# Altium footprint library CMR_Connectors.PcbLib: 71 footprints (part 2 of 5)
Each footprint in its own frame and in the unit in brackets; x right, y up, seen from the top. Pads: shape width x height; smd on the part's side, far side on the other; paste and mask are expansions set on the pad; w line width, h text height; cw(c..) or ccw(c..) is an arc to the next point about the centre after c.
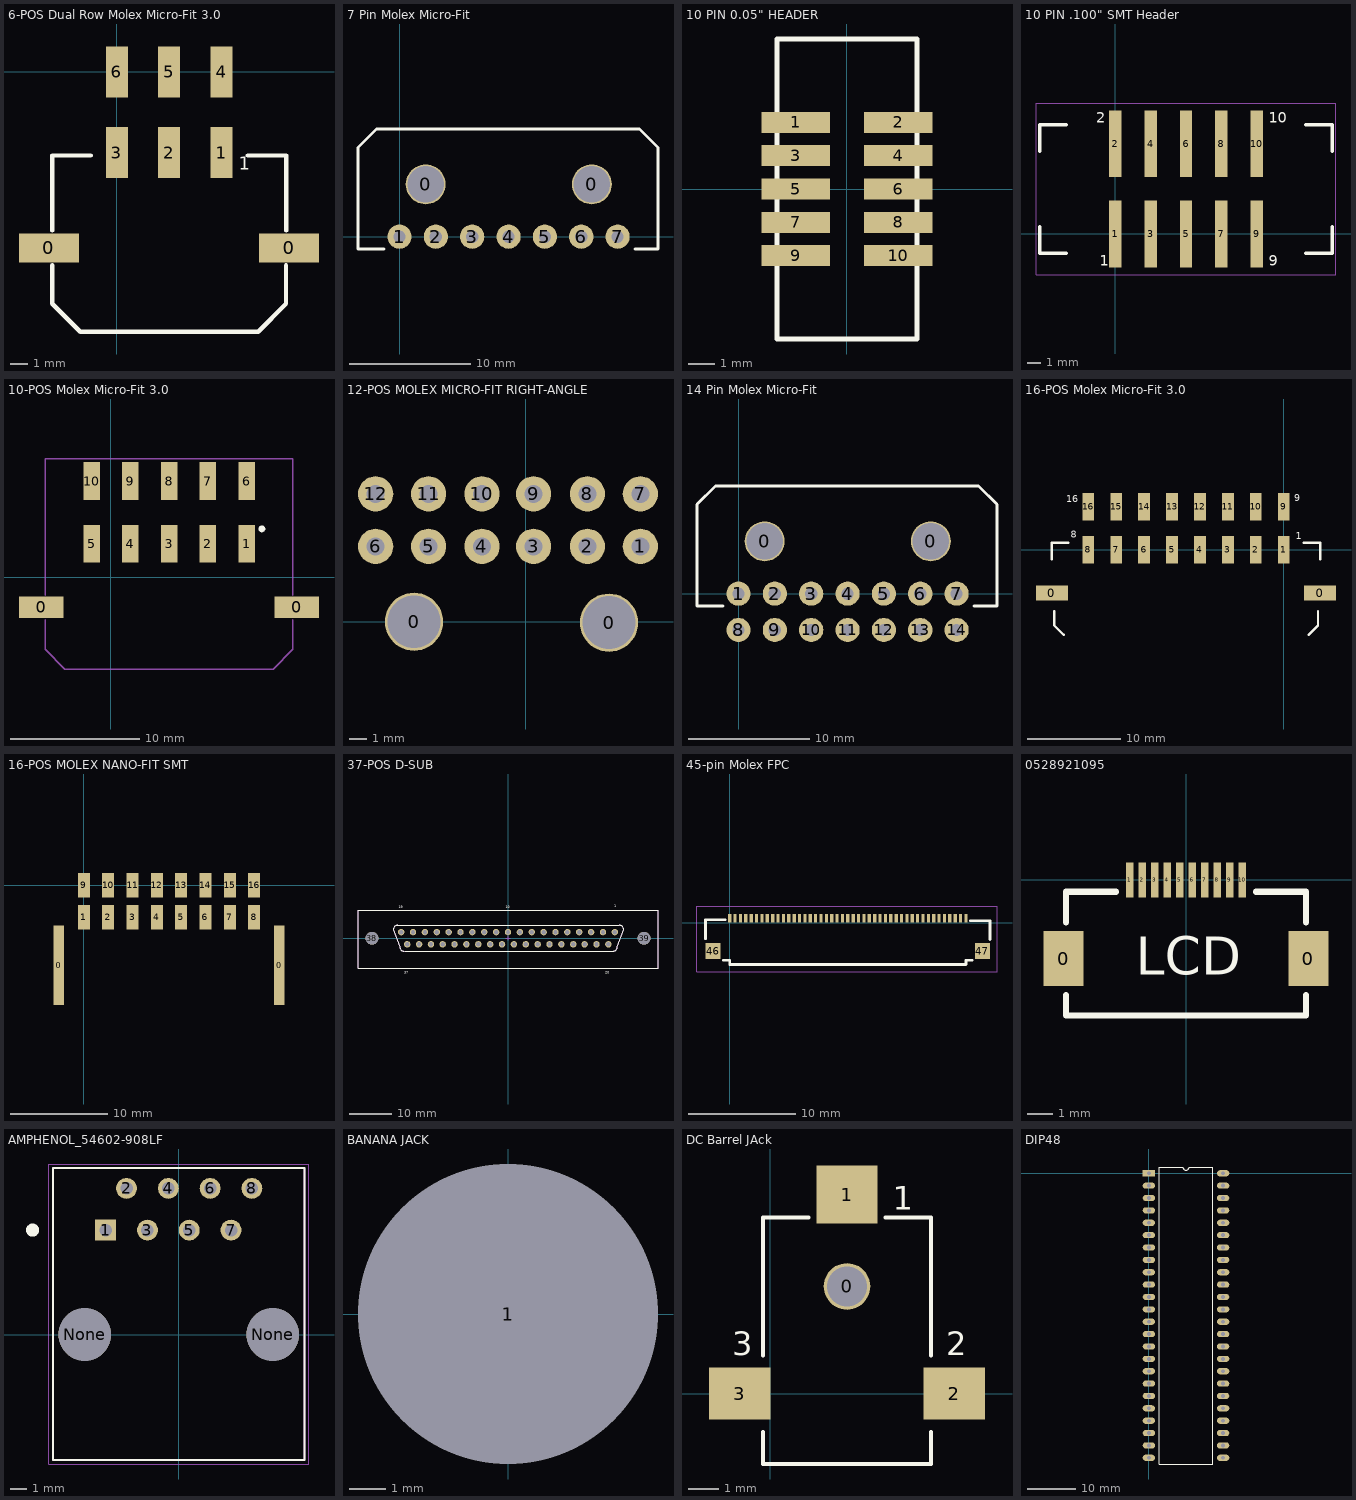
[diagram p1: the footprints below, top view; thin cyan lines are the x and y axes]

## 6-POS Dual Row Molex Micro-Fit 3.0 [mm] "6-POS Dual Row SMT HEADER, Molex Micro-Fit 3.0"
height 8.763
pads (8):
  rect 3.43x1.65 smd: 0(-3.895,-10.1) 0(9.875,-10.1)
  rect 1.27x2.92 smd: 1(6,-4.63) 2(3,-4.63) 3(0,-4.63) 4(6,0) 5(3,0) 6(0,0)
Top Overlay:
  lines w0.254: -3.7,-11.1 -3.7,-13.3 -2.1,-14.9 3,-14.9 8.1,-14.9 9.7,-13.3 9.7,-11.1 ; -3.7,-9.1 -3.7,-4.8 -1.5,-4.8 ; 7.5,-4.8 9.7,-4.8 9.7,-9.1
  text "1" at 7,-5.63 h0.76
3D body "430250600.stp": height 10.66, standoff -0.19, extent -1.9,-28.75 7.95,-14.75
3D body "430450610.stp": height 8.76, standoff -0.05, extent -5.325,-14.655 11.325,0.745

## 7 Pin Molex Micro-Fit [mm] "7 Pin Molex Micro-Fit"
pads (9):
  round 3.302 hole 2.997: 0(2.159,4.318) 0(15.875,4.318)
  round 2 hole 1.016: 1(0,0) 2(3,0) 3(6,0) 4(9,0) 5(12,0) 6(15,0) 7(18,0)
Top Overlay:
  lines w0.254: -1.27,-1.016 -3.429,-1.016 -3.429,3.175 -3.429,5.715 -3.429,7.366 -1.905,8.89 4.699,8.89 19.812,8.89 21.336,7.366 21.336,5.715 21.336,3.048 21.336,-1.016 19.431,-1.016
3D body "436500700.stp": height 5.55, standoff -3.36, extent -3.303,-1.013 21.337,8.887
3D body "436450700.stp": height 6.96, standoff -0.25, extent -1.925,9.05 19.925,23.05

## 10 PIN 0.05" HEADER [mm]
height 5.4
pads (10):
  rect 2.6x0.8 smd: 1(-1.95,2.54) 2(1.95,2.54) 3(-1.95,1.27) 4(1.95,1.27) 5(-1.95,0) 6(1.95,0) 7(-1.95,-1.27) 8(1.95,-1.27) 9(-1.95,-2.54) 10(1.95,-2.54)
Top Overlay:
  lines w0.2: -0.318,5.715 2.667,5.715 2.667,-5.715 -2.667,-5.715 -2.667,5.715 0.318,5.715
  text "." at -3.937,2.413 h1.52
3D body: height 5.4, standoff 0, extent -2.54,-5.588 2.54,5.588

## 10 PIN .100" SMT Header [mm]
height 9.8
pads (10):
  rect 0.89x4.8 smd: 1(0,0) 2(0,6.5) 3(2.54,0) 4(2.54,6.5) 5(5.08,0) 6(5.08,6.5) 7(7.62,0) 8(7.62,6.5) 9(10.16,0) 10(10.16,6.5)
Top Overlay:
  lines w0.254: -5.461,0.508 -5.461,-1.397 -3.556,-1.397 ; -5.461,5.969 -5.461,7.874 -3.556,7.874 ; 13.716,-1.397 15.621,-1.397 15.621,0.508 ; 13.716,7.874 15.621,7.874 15.621,5.969
  text "10" at 11.049,8.001 h0.76
  text "9" at 11.049,-2.286 h0.76
  text "2" at -1.397,8.001 h0.76
  text "1" at -1.143,-2.286 h0.76
Mechanical 15:
  lines w0.051: -5.715,-2.921 15.875,-2.921 15.875,9.398 -5.715,9.398 -5.715,-2.921
3D body "IDC.STEP": height 12.31, standoff 1.81, extent -3.557,-0.492 13.704,6.458
3D body: height 1.8, standoff 0.8, extent -5.22,-1.15 15.38,7.65
3D body: height 9.8, standoff 0.8, extent -5.22,-1.15 -4.52,7.65
3D body: height 9.8, standoff 0.8, extent -5.22,6.95 15.38,7.65
3D body: height 9.8, standoff 0.8, extent 14.68,-1.15 15.38,7.65
3D body: height 9.8, standoff 0.8, extent 7.38,-1.15 15.38,-0.45
3D body: height 9.8, standoff 0.8, extent -5.22,-1.15 2.78,-0.45
3D body: height 0.8, standoff 0, extent -0.315,-1.92 0.325,2.305
3D body: height 8, standoff 0.8, extent -0.315,1.665 0.325,2.305
3D body: height 8, standoff 0.8, extent -0.315,4.205 0.325,4.845
3D body: height 8, standoff 0.8, extent 2.22,1.665 2.86,2.305
3D body: height 8, standoff 0.8, extent 2.22,4.205 2.86,4.845
3D body: height 8, standoff 0.8, extent 4.76,1.665 5.4,2.305
3D body: height 8, standoff 0.8, extent 4.76,4.205 5.4,4.845
3D body: height 8, standoff 0.8, extent 7.3,1.665 7.94,2.305
3D body: height 8, standoff 0.8, extent 7.3,4.205 7.94,4.845
3D body: height 8, standoff 0.8, extent 9.84,1.665 10.48,2.305
3D body: height 8, standoff 0.8, extent 9.84,4.205 10.48,4.845
3D body: height 0.8, standoff 0, extent 2.22,-1.92 2.86,2.305
3D body: height 0.8, standoff 0, extent 4.76,-1.92 5.4,2.305
3D body: height 0.8, standoff 0, extent 7.3,-1.92 7.94,2.305
3D body: height 0.8, standoff 0, extent 9.84,-1.92 10.48,2.305
3D body: height 0.8, standoff 0, extent 9.84,4.205 10.48,8.43
3D body: height 0.8, standoff 0, extent 7.3,4.205 7.94,8.43
3D body: height 0.8, standoff 0, extent 4.76,4.205 5.4,8.43
3D body: height 0.8, standoff 0, extent 2.22,4.205 2.86,8.43
3D body: height 0.8, standoff 0, extent -0.315,4.205 0.325,8.43

## 10-POS Molex Micro-Fit 3.0 [mil] "10-POS SMT HEADER, Molex Micro-Fit 3.0"
height 345
pads (12):
  rect 135x65 smd mask+3: 0(-212,-91.5) 0(566.33,-91.5)
  rect 50x115 smd mask+3: 1(413.83,101.5) 2(295.72,101.5) 3(177.61,101.5) 4(59.5,101.5) 5(-58.5,101.5) 6(413.83,292.5) 7(295.72,292.5) 8(177.61,292.5) 9(59.5,292.5) 10(-58.5,292.5)
Top Overlay:
  circle w10: c460,147 r5.39
Mechanical 1:
  lines w5: -200,-130 -200,-220 -140,-280 494.09,-280 ; -200,-55 -200,360 554.33,360 554.33,-55 ; 494.33,-280 554.33,-220 554.33,-130
3D body "430451010.stp": height 345.35, standoff 0.08, extent -268.69,-273.81 623.04,332.49
3D body "430251000.stp": height 419.69, standoff -7.48, extent -134.84,-831.69 489.17,-280.51

## 12-POS MOLEX MICRO-FIT RIGHT-ANGLE [mm] "12-POS MOLEX MICRO-FIT RIGHT-ANGLE"
height 9.1
pads (14):
  round 3.302 hole 2.997: 0(-6.325,0) 0(4.725,-0.05)
  round 2 hole 1.016: 1(6.5,4.275) 2(3.5,4.275) 3(0.45,4.275) 4(-2.475,4.275) 5(-5.5,4.275) 6(-8.5,4.275) 7(6.5,7.25) 8(3.5,7.25) 9(0.45,7.25) 10(-2.475,7.25) 11(-5.5,7.25) 12(-8.5,7.25)
3D body "430451200.stp": height 8.83, standoff -3.12, extent -12.075,-4.662 10.075,7.578
3D body: height 0.25, standoff 0, extent -0.725,0.15 -0.725,0.15
3D body: height 0.25, standoff 0, extent -1,0.287 -1,0.287
3D body "430251200.stp": height 10.71, standoff -0.14, extent -10.545,-18.7 8.305,-4.7

## 14 Pin Molex Micro-Fit [mm] "14 Pin Molex Micro-Fit"
pads (16):
  round 3.302 hole 2.997: 0(2.159,4.318) 0(15.875,4.318)
  round 2 hole 1.016: 1(0,0) 2(3,0) 3(6,0) 4(9,0) 5(12,0) 6(15,0) 7(18,0) 8(0,-3) 9(3,-3) 10(6,-3) 11(9,-3) 12(12,-3) 13(15,-3) 14(18,-3)
Top Overlay:
  lines w0.254: -1.27,-1.016 -3.429,-1.016 -3.429,3.175 -3.429,5.715 -3.429,7.366 -1.905,8.89 4.699,8.89 19.812,8.89 21.336,7.366 21.336,5.715 21.336,3.048 21.336,-1.016 19.431,-1.016
3D body "430251400.stp": height 10.66, standoff -0.19, extent -1.925,9.025 19.925,23.025
3D body "430451402.stp": height 8.8, standoff -3.15, extent -3.558,-3.353 21.592,8.887

## 16-POS Molex Micro-Fit 3.0 [mil] "16-POS SMT HEADER, Molex Micro-Fit 3.0"
height 345
pads (18):
  rect 135x65 smd mask+3: 0(-979.5,-183) 0(153.5,-183)
  rect 50x115 smd mask+3: 1(0,0) 2(-118,0) 3(-236,0) 4(-354,0) 5(-472,0) 6(-590,0) 7(-708,0) 8(-826,0) 9(0,182) 10(-118,182) 11(-236,182) 12(-354,182) 13(-472,182) 14(-590,182) 15(-708,182) 16(-826,182)
Top Overlay:
  lines w10: -980,-40 -980,30 -910,30 ; -970,-260 -970,-320 -930,-360 ; 85,30 155,30 155,-40 ; 105,-360 145,-320 145,-260
  text "16" at -920,200 h30
  text "8" at -900,50 h30
  text "9" at 45,205 h30
  text "1" at 50,45 h30
3D body "430451609.stp": height 345.35, standoff -1.5, extent -1036.03,-370.57 210.04,235.72
3D body "430251608.stp": height 419.17, standoff -7.99, extent -901.57,-925.2 76.77,-374.02

## 16-POS MOLEX NANO-FIT SMT [mm]
pads (18):
  rect 1.1x8.2 smd: 0(-2.57,-8.23) 0(20.07,-8.23)
  rect 1.24x2.5 smd: 1(0,-3.3) 2(2.5,-3.3) 3(5,-3.3) 4(7.5,-3.3) 5(10,-3.3) 6(12.5,-3.3) 7(15,-3.3) 8(17.5,-3.3) 9(0,0) 10(2.5,0) 11(5,0) 12(7.5,0) 13(10,0) 14(12.5,0) 15(15,0) 16(17.5,0)
3D body "1053081216.stp": height 10.11, standoff -0.35, extent -2.5,-28.825 20.2,-13.125
3D body "1054051316.stp": height 9.5, standoff 0.01, extent -3.395,-14.125 20.345,0.615

## 37-POS D-SUB [mm] "D-SUB- 37P, FEMALE, STRAIGHT, TH"
height 12
pads (39):
  round 1.5 hole 1 unplated: 1(24.93,1.42) 2(22.16,1.42) 3(19.39,1.42) 4(16.62,1.42) 5(13.85,1.42) 6(11.08,1.42) 7(8.31,1.42) 8(5.54,1.42) 9(2.77,1.42) 10(0,1.42) 11(-2.77,1.42) 12(-5.54,1.42) 13(-8.31,1.42) 14(-11.08,1.42) 15(-13.85,1.42) 16(-16.62,1.42) 17(-19.39,1.42) 18(-22.16,1.42) 19(-24.93,1.42) 20(23.42,-1.42) 21(20.65,-1.42) 22(17.88,-1.42) 23(15.23,-1.42) 24(12.46,-1.42) 25(9.69,-1.42) 26(6.92,-1.42) 27(4.15,-1.42) 28(1.38,-1.42) 29(-1.39,-1.42) 30(-4.16,-1.42) 31(-6.93,-1.42) 32(-9.7,-1.42) 33(-12.47,-1.42) 34(-15.24,-1.42) 35(-17.98,-1.42) 36(-20.75,-1.42) 37(-23.52,-1.42)
  round 3 hole 3 unplated: 38(-31.75,0) 39(31.75,0)
Top Overlay:
  lines w0.254: -26,3 26,3 cw(c26,2) 27,2 25.5,-2 cw(c24.5,-2) 24.5,-3 -24,-3 ; -25.75,3 ccw(c-25.75,2) -26.75,2 -25.25,-2 ccw(c-24.25,-2) -24.25,-3 ; -35,-7 35,-7 35,6.5 -35,6.5 -35,-7
  text "10" at -0.5,7 h0.64
  text "19" at -25.5,7 h0.64
  text "37" at -24.25,-8.25 h0.64
  text "1" at 24.75,7.25 h0.64
  text "20" at 22.75,-8.25 h0.64
Mechanical 15:
  lines w0.102: -0.5,0 0.5,0 ; 0,-0.5 0,0.5
  lines w0.254: -35,-7 -35,6.5 35,6.5 35,-7 -35,-7 ; -26.75,2 cw(c-25.75,2) -25.75,3 26,3 cw(c26,2) 27,2 25.5,-2 cw(c24.5,-2) 24.5,-3 -24.25,-3 cw(c-24.25,-2) -25.25,-2 -26.75,2

## 45-pin Molex FPC [mm] "Molex FPC connector, SMT, 45 pos"
pads (47):
  rect 0.3x0.8 smd: 1(0,0.4) 2(0.5,0.4) 3(1,0.4) 4(1.5,0.4) 5(2,0.4) 6(2.5,0.4) 7(3,0.4) 8(3.5,0.4) 9(4,0.4) 10(4.5,0.4) 11(5,0.4) 12(5.5,0.4) 13(6,0.4) 14(6.5,0.4) 15(7,0.4) 16(7.5,0.4) 17(8,0.4) 18(8.5,0.4) 19(9,0.4) 20(9.5,0.4) 21(10,0.4) 22(10.5,0.4) 23(11,0.4) 24(11.5,0.4) 25(12,0.4) 26(12.5,0.4) 27(13,0.4) 28(13.5,0.4) 29(14,0.4) 30(14.5,0.4) 31(15,0.4) 32(15.5,0.4) 33(16,0.4) 34(16.5,0.4) 35(17,0.4) 36(17.5,0.4) 37(18,0.4) 38(18.5,0.4) 39(19,0.4) 40(19.5,0.4) 41(20,0.4) 42(20.5,0.4) 43(21,0.4) 44(21.5,0.4) 45(22,0.4)
  rect 1.4x1.5 smd: 46(-1.55,-2.65) 47(23.54,-2.65)
Top Overlay:
  lines w0.254: -2.26,-1.505 -2.26,0.26 -0.435,0.26 ; -0.6,-3.495 0,-3.495 ; -0.005,-3.495 -0.005,-3.89 22,-3.89 22,-3.495 22.575,-3.495 ; 22.415,0.185 24.24,0.185 24.24,-1.58
Mechanical 15:
  lines w0.051: -3.048,-4.572 24.384,-4.572 24.892,-4.572 24.892,1.524 -3.048,1.524 -3.048,-4.572
3D body "512964594.stp": height 1.27, standoff -0.03, extent -2.11,-3.609 24.09,0.69

## 0528921095 [mm]
pads (12):
  rect 1.6x2.2 smd: 0(-4.9,-3.15) 0(4.9,-3.15)
  rect 0.3x1.4 smd: 1(-2.25,0) 2(-1.75,0) 3(-1.25,0) 4(-0.75,0) 5(-0.25,0) 6(0.25,0) 7(0.75,0) 8(1.25,0) 9(1.75,0) 10(2.25,0)
Top Overlay:
  lines w0.254: -4.8,-4.6 -4.8,-5.425 4.8,-5.425 4.8,-4.6 ; -4.8,-1.7 -4.8,-0.475 -2.8,-0.475 ; 2.8,-0.475 4.8,-0.475 4.8,-1.7
  text "LCD" at -2,-3.8 h1.52
3D body "528921095.stp": height 2, standoff -0.04, extent -5.2,-5.5 5.2,0

## AMPHENOL_54602-908LF [mm]
pads (10):
  rect 1.268x1.268 hole 0.76: 1(-4.445,6.35)
  round 1.268 hole 0.76: 2(-3.175,8.89) 3(-1.905,6.35) 4(-0.635,8.89) 5(0.635,6.35) 6(1.905,8.89) 7(3.175,6.35) 8(4.445,8.89)
  round 3.2 hole 3.2 unplated: None(-5.715,0) None(5.715,0)
Top Overlay:
  circle w0.4: c-8.89,6.35 r0.2
  lines w0.127: -7.65,-7.62 7.65,-7.62 7.65,10.12 -7.65,10.12 -7.65,-7.62
Mechanical 1:
  lines w0.127: -7.65,-7.62 7.65,-7.62 7.65,10.12 -7.65,10.12 -7.65,-7.62
Mechanical 4:
  lines w0.05: -7.9,-7.87 7.9,-7.87 7.9,10.37 -7.9,10.37 -7.9,-7.87

## BANANA JACK [mil] "BANANA JACK 8mm HOLE"
height 187.99
pads (1):
  round 60 hole 327.95: 1(0,0)
3D body: height -469, standoff -750, extent -93.5,-14.76 93.51,14.77
3D body: height 187.99, standoff 0, extent -218.89,-218.89 218.91,218.9
3D body: height -0.02, standoff -469.02, extent -116.99,-116.99 117.01,117

## DC Barrel JAck [mm] "16V 1A DC Barrel Jack"
height 1.016
pads (4):
  round 1.524 hole 1.3: 0(2.5,3.5)
  rect 2x1.9 smd mask+0.076: 1(2.5,6.5)
  rect 2x1.7 smd mask+0.076: 2(6,0) 3(-1,0)
Top Overlay:
  lines w0.127: -0.25,-1.25 -0.25,-2.3 5.25,-2.3 5.25,-1.25 ; -0.25,1.25 -0.25,5.75 1.25,5.75 ; 3.75,5.75 5.25,5.75 5.25,1.25
  text "3" at -1.25,1.25 h0.76
  text "2" at 5.75,1.25 h0.76
  text "1" at 4,6 h0.76
3D body "pj-040-smt.stp": height 3.13, standoff -0.57, extent -1.2,-4 6.2,6.9

## DIP48 [mil]
pads (48):
  rect 100x50 hole 31: 1(0,0)
  oval 100x50 hole 31: 2(0,-100) 3(0,-200) 4(0,-300) 5(0,-400) 6(0,-500) 7(0,-600) 8(0,-700) 9(0,-800) 10(0,-900) 11(0,-1000) 12(0,-1100) 13(0,-1200) 14(0,-1300) 15(0,-1400) 16(0,-1500) 17(0,-1600) 18(0,-1700) 19(0,-1800) 20(0,-1900) 21(0,-2000) 22(0,-2100) 23(0,-2200) 24(0,-2300) 25(600,-2300) 26(600,-2200) 27(600,-2100) 28(600,-2000) 29(600,-1900) 30(600,-1800) 31(600,-1700) 32(600,-1600) 33(600,-1500) 34(600,-1400) 35(600,-1300) 36(600,-1200) 37(600,-1100) 38(600,-1000) 39(600,-900) 40(600,-800) 41(600,-700) 42(600,-600) 43(600,-500) 44(600,-400) 45(600,-300) 46(600,-200) 47(600,-100) 48(600,0)
Top Overlay:
  lines w10: 85,-2350 515,-2350 515,50 325,50 cw(c300,50) 275,50 85,50 85,-2350
3D body "4840-600X.stp": height 210.74, standoff -114.26, extent -50,-2147.11 650,-152.11